# Altium schematic symbol library NXP_60_26022015.SCHLIB: 1306 symbols (part 24 of 28)
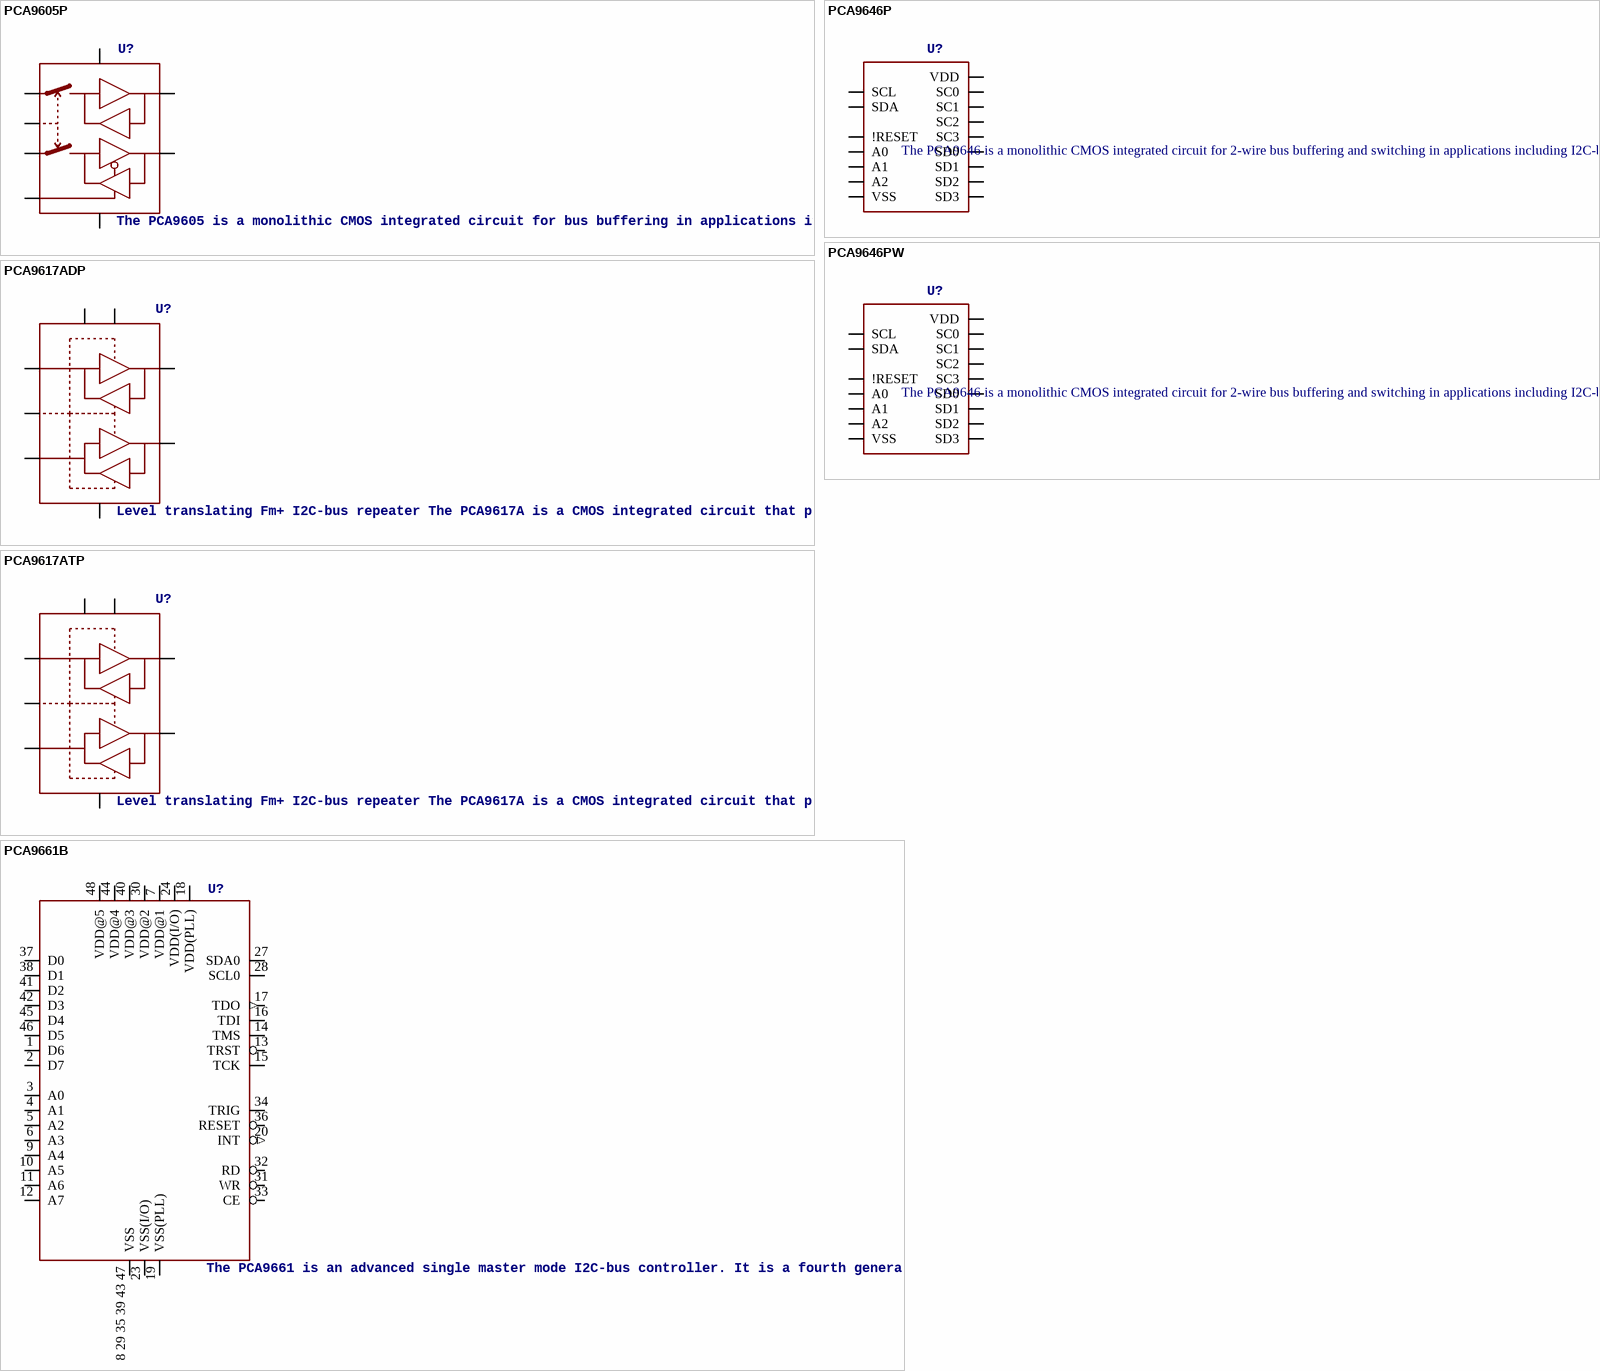
[diagram p208: symbols PCA9605P to PCA9661B]

## PCA9646P
designator U?, comment The PCA9646 is a monolithic CMOS integrated circuit for 2-wire bus buffering and switching in applications including I2C-bus, SMBus, PMBus, and other systems based on similar principles.   AAL Eindhoven MK
footprint SOT109-1
pins: 1 A0, 2 A1, 3 !RESET, 4 SD0, 5 SC0, 6 SD1, 7 SC1, 8 VSS (power), 9 SD2, 10 SC2, 11 SD3, 12 SC3, 13 A2, 14 SCL, 15 SDA, 16 VDD (power)

## PCA9646PW
designator U?, comment The PCA9646 is a monolithic CMOS integrated circuit for 2-wire bus buffering and switching in applications including I2C-bus, SMBus, PMBus, and other systems based on similar principles.   AAL Eindhoven MK
footprint SOT403-1
pins: 1 A0, 2 A1, 3 !RESET, 4 SD0, 5 SC0, 6 SD1, 7 SC1, 8 VSS (power), 9 SD2, 10 SC2, 11 SD3, 12 SC3, 13 A2, 14 SCL, 15 SDA, 16 VDD (power)

## PCA9661B
designator U?, comment The PCA9661 is an advanced single master mode I2C-bus controller. It is a fourth generation bus controller designed for data intensive I2C-bus data transfers. AAL Eindhoven MK
footprint SOT313-2
pins: 1 D6, 2 D7, 3 A0, 4 A1, 5 A2, 6 A3, 7 VDD@1 (power), 8 29 35 39 43 47 VSS (power), 9 A4, 10 A5, 11 A6, 12 A7, 13 TRST, 14 TMS, 15 TCK, 16 TDI, 17 TDO (out), 18 VDD(PLL) (power), 19 VSS(PLL) (power), 20 INT (out), 23 VSS(I/O) (power), 24 VDD(I/O) (power), 27 SDA0, 28 SCL0, 30 VDD@2 (power), 31 WR, 32 RD, 33 CE, 34 TRIG, 36 RESET, 37 D0, 38 D1, 40 VDD@3 (power), 41 D2, 42 D3, 44 VDD@4 (power), 45 D4, 46 D5, 48 VDD@5 (power)

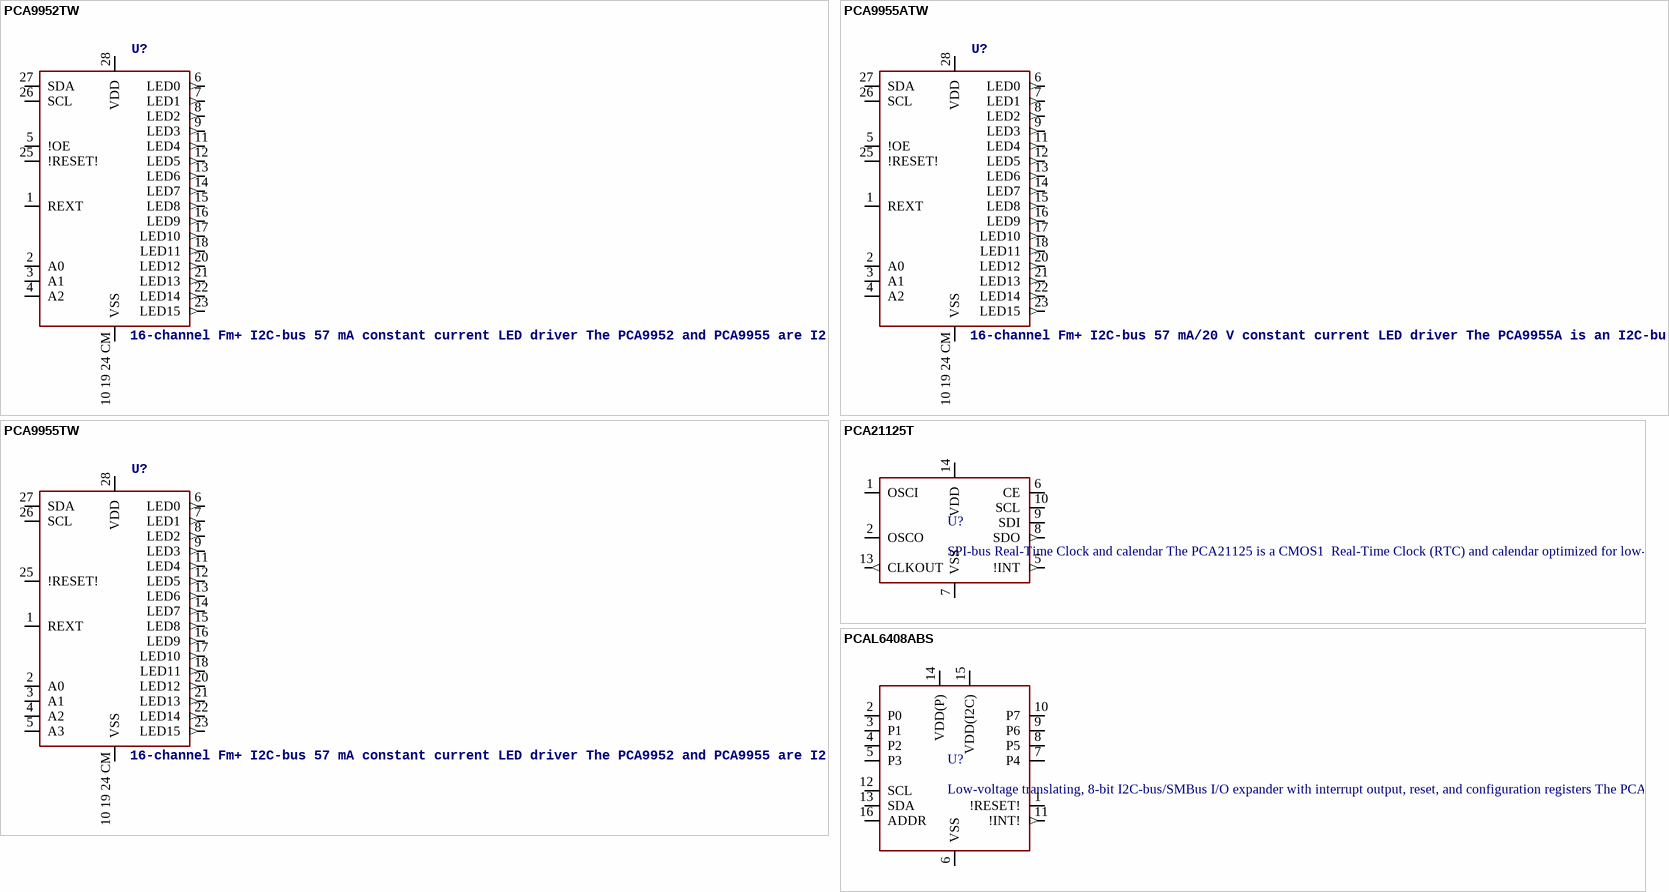
[diagram p161: symbols PCA9952TW to PCAL6408ABS]

## PCA9952TW
designator U?, comment 16-channel Fm+ I2C-bus 57 mA constant current LED driver The PCA9952 and PCA9955 are I2 C-bus controlled 16-channel constant current LED driver optimized for dimming and blinking 57 mA Red/Green/Blue/Amber (RGBA) LEDs in amusement products. Each LEDn output has its own 8-bit resolution (256 steps) fixed frequency individual PWM controller that operates at 31.25 kHz with a duty cycle that is adjustable from 0 % to 99.6 % to allow the LED to be set to a specific brightness value. An additional 8-bit resolution (256 steps) group PWM controller has both a fixed frequency of 122 Hz and an adjustable frequency between 15 Hz to once every 16.8 seconds with a duty cycle that is adjustable from 0 % to 99.6 % that is used to either dim or blink all LEDs with the same value. Each LEDn output can be off, on (no PWM control), set at its individual PWM controller value or at both individual and group PWM controller values. The PCA9952 and PCA9955 operate with a supply voltage range of 3 V to 5.5 V and the constant current sink LEDn outputs allow up to 40 V for the LED supply. The output peak current is adjustable with an 8-bit linear DAC from 225 uA to 57 mA. These devices have built-in open, short load and overtemperature detection circuitry. The error information from the corresponding register can be read via the I2 C-bus. Additionally, a thermal shutdown feature protects the device when internal junction temperature exceeds the limit allowed for the process. The PCA9952 and PCA9955 devices have Fast-mode Plus (Fm+) I2 C-bus interface. Fm+ devices offer higher frequency (up to 1 MHz) or more densely populated bus operation (up to 4000 pF). The PCA9952 is identical to PCA9955 except for the following differences: The PCA9952 has only three hardware address pins compared to four on PCA9955.  The PCA9952 has an output enable pin (OE) and the PCA9955 does not.   The active LOW output enable input pin (OE), available only on PCA9952, blinks all the LEDn outputs and can be used to externally PWM the outputs, which is useful when multiple devices need to be dimmed or blinked together without using software control. Software programmable LED Group and three Sub Call I2 C-bus addresses allow all or defined groups of PCA9952/55 devices to respond to a common I2 C-bus address, allowing for example, all red LEDs to be turned on or off at the same time or marquee chasing effect, thus minimizing I2 C-bus commands. On power-up, PCA9952/55 will have a unique Sub Call address to identify it as a 16-channel LED driver. This allows mixing of devices with different channel widths. Four hardware address pins on PCA9955 allow up to 16 devices on the same bus. In the case of PCA9952, three hardware address pins allow up to 8 devices on the same bus. The Software Reset (SWRST) function allows the master to perform a reset of the PCA9952/55 through the I2 C-bus, identical to the Power-On Reset (POR) that initializes the registers to their default state causing the output current switches to be OFF (LED off). This allows an easy and quick way to reconfigure all device registers to the same condition.    AAL Eindhoven MK
footprint SOT1172-2
pins: 1 REXT, 2 A0, 3 A1, 4 A2, 5 !OE, 6 LED0 (out), 7 LED1 (out), 8 LED2 (out), 9 LED3 (out), 10 19 24 CM VSS (power), 11 LED4 (out), 12 LED5 (out), 13 LED6 (out), 14 LED7 (out), 15 LED8 (out), 16 LED9 (out), 17 LED10 (out), 18 LED11 (out), 20 LED12 (out), 21 LED13 (out), 22 LED14 (out), 23 LED15 (out), 25 !RESET!, 26 SCL, 27 SDA, 28 VDD (power)

## PCA9955ATW
designator U?, comment 16-channel Fm+ I2C-bus 57 mA/20 V constant current LED driver The PCA9955A is an I2C-bus controlled 16-channel constant current LED driver optimized for dimming and blinking 57 mA Red/Green/Blue/Amber (RGBA) LEDs in amusement products. Each LED output has its own 8-bit resolution (256 steps) fixed frequency individual PWM controller that operates at 31.25 kHz with a duty cycle that is adjustable from 0 % to 100 % to allow the LED to be set to a specific brightness value. An additional 8-bit resolution (256 steps) group PWM controller has both a fixed frequency of 122 Hz and an adjustable frequency between 15 Hz to once every 16.8 seconds with a duty cycle that is adjustable from 0 % to 99.6 % that is used to either dim or blink all LEDs with the same value.    AAL Eindhoven MK
footprint SOT1172-3
pins: 1 REXT, 2 A0, 3 A1, 4 A2, 5 !OE, 6 LED0 (out), 7 LED1 (out), 8 LED2 (out), 9 LED3 (out), 10 19 24 CM VSS (power), 11 LED4 (out), 12 LED5 (out), 13 LED6 (out), 14 LED7 (out), 15 LED8 (out), 16 LED9 (out), 17 LED10 (out), 18 LED11 (out), 20 LED12 (out), 21 LED13 (out), 22 LED14 (out), 23 LED15 (out), 25 !RESET!, 26 SCL, 27 SDA, 28 VDD (power)

## PCA9955TW
designator U?, comment 16-channel Fm+ I2C-bus 57 mA constant current LED driver The PCA9952 and PCA9955 are I2 C-bus controlled 16-channel constant current LED driver optimized for dimming and blinking 57 mA Red/Green/Blue/Amber (RGBA) LEDs in amusement products. Each LEDn output has its own 8-bit resolution (256 steps) fixed frequency individual PWM controller that operates at 31.25 kHz with a duty cycle that is adjustable from 0 % to 99.6 % to allow the LED to be set to a specific brightness value. An additional 8-bit resolution (256 steps) group PWM controller has both a fixed frequency of 122 Hz and an adjustable frequency between 15 Hz to once every 16.8 seconds with a duty cycle that is adjustable from 0 % to 99.6 % that is used to either dim or blink all LEDs with the same value. Each LEDn output can be off, on (no PWM control), set at its individual PWM controller value or at both individual and group PWM controller values. The PCA9952 and PCA9955 operate with a supply voltage range of 3 V to 5.5 V and the constant current sink LEDn outputs allow up to 40 V for the LED supply. The output peak current is adjustable with an 8-bit linear DAC from 225 uA to 57 mA. These devices have built-in open, short load and overtemperature detection circuitry. The error information from the corresponding register can be read via the I2 C-bus. Additionally, a thermal shutdown feature protects the device when internal junction temperature exceeds the limit allowed for the process. The PCA9952 and PCA9955 devices have Fast-mode Plus (Fm+) I2 C-bus interface. Fm+ devices offer higher frequency (up to 1 MHz) or more densely populated bus operation (up to 4000 pF). The PCA9952 is identical to PCA9955 except for the following differences: The PCA9952 has only three hardware address pins compared to four on PCA9955.  The PCA9952 has an output enable pin (OE) and the PCA9955 does not.   The active LOW output enable input pin (OE), available only on PCA9952, blinks all the LEDn outputs and can be used to externally PWM the outputs, which is useful when multiple devices need to be dimmed or blinked together without using software control. Software programmable LED Group and three Sub Call I2 C-bus addresses allow all or defined groups of PCA9952/55 devices to respond to a common I2 C-bus address, allowing for example, all red LEDs to be turned on or off at the same time or marquee chasing effect, thus minimizing I2 C-bus commands. On power-up, PCA9952/55 will have a unique Sub Call address to identify it as a 16-channel LED driver. This allows mixing of devices with different channel widths. Four hardware address pins on PCA9955 allow up to 16 devices on the same bus. In the case of PCA9952, three hardware address pins allow up to 8 devices on the same bus. The Software Reset (SWRST) function allows the master to perform a reset of the PCA9952/55 through the I2 C-bus, identical to the Power-On Reset (POR) that initializes the registers to their default state causing the output current switches to be OFF (LED off). This allows an easy and quick way to reconfigure all device registers to the same condition.    AAL Eindhoven MK
footprint SOT1172-2
pins: 1 REXT, 2 A0, 3 A1, 4 A2, 5 A3, 6 LED0 (out), 7 LED1 (out), 8 LED2 (out), 9 LED3 (out), 10 19 24 CM VSS (power), 11 LED4 (out), 12 LED5 (out), 13 LED6 (out), 14 LED7 (out), 15 LED8 (out), 16 LED9 (out), 17 LED10 (out), 18 LED11 (out), 20 LED12 (out), 21 LED13 (out), 22 LED14 (out), 23 LED15 (out), 25 !RESET!, 26 SCL, 27 SDA, 28 VDD (power)

## PCA21125T
designator U?, comment SPI-bus Real-Time Clock and calendar The PCA21125 is a CMOS1  Real-Time Clock (RTC) and calendar optimized for low-power consumption and an operating temperature up to 125 °C. Data is transferred via a Serial Peripheral Interface (SPI-bus) with a maximum data rate of 6.0 Mbit/s. Alarm and timer functions are also available with the possibility to generate a wake-up signal on the interrupt pin. AEC Q100 compliant for automotive applications.    AAL Eindhoven MK
footprint SOT402-1
pins: 1 OSCI, 2 OSCO, 5 !INT (out), 6 CE, 7 VSS (power), 8 SDO (out), 9 SDI, 10 SCL, 13 CLKOUT (out), 14 VDD (power)

## PCAL6408ABS
designator U?, comment Low-voltage translating, 8-bit I2C-bus/SMBus I/O expander with interrupt output, reset, and configuration registers The PCAL6408A is an 8-bit general purpose I/O expander that provides remote I/O expansion for most microcontroller families via the I2C-bus interface.    AAL Eindhoven MK
footprint SOT758-1
pins: 1 !RESET!, 2 P0, 3 P1, 4 P2, 5 P3, 6 VSS, 7 P4, 8 P5, 9 P6, 10 P7, 11 !INT! (out), 12 SCL, 13 SDA, 14 VDD(P) (power), 15 VDD(I2C) (power), 16 ADDR

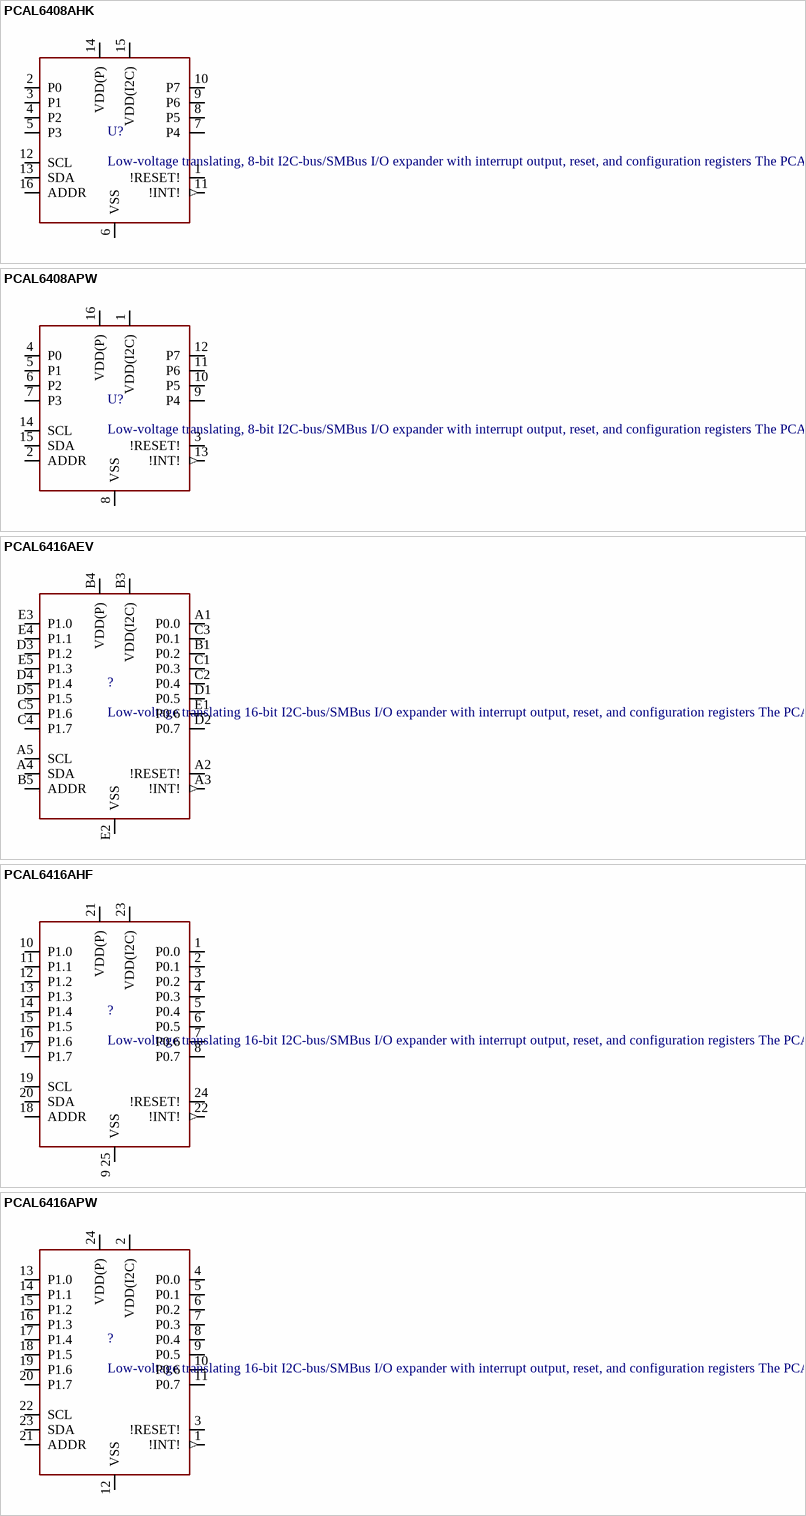
[diagram p162: symbols PCAL6408AHK to PCAL6416APW]

## PCAL6408AHK
designator U?, comment Low-voltage translating, 8-bit I2C-bus/SMBus I/O expander with interrupt output, reset, and configuration registers The PCAL6408A is an 8-bit general purpose I/O expander that provides remote I/O expansion for most microcontroller families via the I2C-bus interface.    AAL Eindhoven MK
footprint SOT1161-1
pins: 1 !RESET!, 2 P0, 3 P1, 4 P2, 5 P3, 6 VSS, 7 P4, 8 P5, 9 P6, 10 P7, 11 !INT! (out), 12 SCL, 13 SDA, 14 VDD(P) (power), 15 VDD(I2C) (power), 16 ADDR

## PCAL6408APW
designator U?, comment Low-voltage translating, 8-bit I2C-bus/SMBus I/O expander with interrupt output, reset, and configuration registers The PCAL6408A is an 8-bit general purpose I/O expander that provides remote I/O expansion for most microcontroller families via the I2C-bus interface.    AAL Eindhoven MK
footprint SOT403-1
pins: 1 VDD(I2C) (power), 2 ADDR, 3 !RESET!, 4 P0, 5 P1, 6 P2, 7 P3, 8 VSS, 9 P4, 10 P5, 11 P6, 12 P7, 13 !INT! (out), 14 SCL, 15 SDA, 16 VDD(P) (power)

## PCAL6416AEV
designator ?, comment Low-voltage translating 16-bit I2C-bus/SMBus I/O expander with interrupt output, reset, and configuration registers The PCAL6416A is a 16-bit general-purpose I/O expander that provides remote I/O expansion for most microcontroller families via the I2C-bus interface. NXP I/O expanders provide a simple solution when additional I/Os are needed while keeping interconnections to a minimum, for example, in battery-powered mobile applications for interfacing to sensors, push buttons, keypad, etc. In addition to providing a flexible set of GPIOs, it simplifies interconnection of a processor running at one voltage level to I/O devices operating at a different (usually higher) voltage level. The PCAL6416A has built-in level shifting feature that makes these devices extremely flexible in mixed signal environments where communication between incompatible I/O voltages is required. Its wide VDD range of 1.65 V to 5.5 V on the dual power rail allows seamless communications with next-generation low voltage microprocessors and microcontrollers on the interface side (SDA/SCL) and peripherals at a higher voltage on the port side. There are two supply voltages for PCAL6416A: VDD(I2C-bus) and VDD(P). VDD(I2C-bus) provides the supply voltage for the interface at the master side (for example, a microcontroller) and the VDD(P) provides the supply for core circuits and Port P. The bidirectional voltage level translation in the PCAL6416A is provided through VDD(I2C-bus). VDD(I2C-bus) should be connected to the VDD of the external SCL/SDA lines. This indicates the VDD level of the I2C-bus to the PCAL6416A, while the voltage level on Port P of the PCAL6416A is determined by the VDD(P). The PCAL6416A contains the PCA6416A register set of four pairs of 8-bit Configuration, Input, Output, and Polarity Inversion registers and additionally, the PCAL6416A has Agile I/O, which are additional features specifically designed to enhance the I/O. These additional features are: programmable output drive strength, latchable inputs, programmable pull-up/pull-down resistors, maskable interrupt, interrupt status register, programmable open-drain or push-pull outputs. The PCAL6416A is a pin-to-pin replacement to the PCA6416A, however, the PCAL6416A powers up with all I/O interrupts masked. This mask default allows for a board bring-up free of spurious interrupts at power-up. At power-on, the I/Os are configured as inputs. However, the system master can enable the I/Os as either inputs or outputs by writing to the I/O configuration bits. The data for each input or output is kept in the corresponding input or output register. The polarity of the Input Port register can be inverted with the Polarity Inversion register, saving external logic gates. Programmable pull-up and pull-down resistors eliminate the need for discrete components.    AAL Eindhoven MK
footprint SOT1199-1
pins: A1 P0.0, A2 !RESET!, A3 !INT! (out), A4 SDA, A5 SCL, B1 P0.2, B3 VDD(I2C) (power), B4 VDD(P) (power), B5 ADDR, C1 P0.3, C2 P0.4, C3 P0.1, C4 P1.7, C5 P1.6, D1 P0.5, D2 P0.7, D3 P1.2, D4 P1.4, D5 P1.5, E1 P0.6, E2 VSS, E3 P1.0, E4 P1.1, E5 P1.3

## PCAL6416AHF
designator ?, comment Low-voltage translating 16-bit I2C-bus/SMBus I/O expander with interrupt output, reset, and configuration registers The PCAL6416A is a 16-bit general-purpose I/O expander that provides remote I/O expansion for most microcontroller families via the I2C-bus interface. NXP I/O expanders provide a simple solution when additional I/Os are needed while keeping interconnections to a minimum, for example, in battery-powered mobile applications for interfacing to sensors, push buttons, keypad, etc. In addition to providing a flexible set of GPIOs, it simplifies interconnection of a processor running at one voltage level to I/O devices operating at a different (usually higher) voltage level. The PCAL6416A has built-in level shifting feature that makes these devices extremely flexible in mixed signal environments where communication between incompatible I/O voltages is required. Its wide VDD range of 1.65 V to 5.5 V on the dual power rail allows seamless communications with next-generation low voltage microprocessors and microcontrollers on the interface side (SDA/SCL) and peripherals at a higher voltage on the port side. There are two supply voltages for PCAL6416A: VDD(I2C-bus) and VDD(P). VDD(I2C-bus) provides the supply voltage for the interface at the master side (for example, a microcontroller) and the VDD(P) provides the supply for core circuits and Port P. The bidirectional voltage level translation in the PCAL6416A is provided through VDD(I2C-bus). VDD(I2C-bus) should be connected to the VDD of the external SCL/SDA lines. This indicates the VDD level of the I2C-bus to the PCAL6416A, while the voltage level on Port P of the PCAL6416A is determined by the VDD(P). The PCAL6416A contains the PCA6416A register set of four pairs of 8-bit Configuration, Input, Output, and Polarity Inversion registers and additionally, the PCAL6416A has Agile I/O, which are additional features specifically designed to enhance the I/O. These additional features are: programmable output drive strength, latchable inputs, programmable pull-up/pull-down resistors, maskable interrupt, interrupt status register, programmable open-drain or push-pull outputs. The PCAL6416A is a pin-to-pin replacement to the PCA6416A, however, the PCAL6416A powers up with all I/O interrupts masked. This mask default allows for a board bring-up free of spurious interrupts at power-up. At power-on, the I/Os are configured as inputs. However, the system master can enable the I/Os as either inputs or outputs by writing to the I/O configuration bits. The data for each input or output is kept in the corresponding input or output register. The polarity of the Input Port register can be inverted with the Polarity Inversion register, saving external logic gates. Programmable pull-up and pull-down resistors eliminate the need for discrete components.    AAL Eindhoven MK
footprint SOT994-1
pins: 1 P0.0, 2 P0.1, 3 P0.2, 4 P0.3, 5 P0.4, 6 P0.5, 7 P0.6, 8 P0.7, 9 25 VSS, 10 P1.0, 11 P1.1, 12 P1.2, 13 P1.3, 14 P1.4, 15 P1.5, 16 P1.6, 17 P1.7, 18 ADDR, 19 SCL, 20 SDA, 21 VDD(P) (power), 22 !INT! (out), 23 VDD(I2C) (power), 24 !RESET!

## PCAL6416APW
designator ?, comment Low-voltage translating 16-bit I2C-bus/SMBus I/O expander with interrupt output, reset, and configuration registers The PCAL6416A is a 16-bit general-purpose I/O expander that provides remote I/O expansion for most microcontroller families via the I2C-bus interface. NXP I/O expanders provide a simple solution when additional I/Os are needed while keeping interconnections to a minimum, for example, in battery-powered mobile applications for interfacing to sensors, push buttons, keypad, etc. In addition to providing a flexible set of GPIOs, it simplifies interconnection of a processor running at one voltage level to I/O devices operating at a different (usually higher) voltage level. The PCAL6416A has built-in level shifting feature that makes these devices extremely flexible in mixed signal environments where communication between incompatible I/O voltages is required. Its wide VDD range of 1.65 V to 5.5 V on the dual power rail allows seamless communications with next-generation low voltage microprocessors and microcontrollers on the interface side (SDA/SCL) and peripherals at a higher voltage on the port side. There are two supply voltages for PCAL6416A: VDD(I2C-bus) and VDD(P). VDD(I2C-bus) provides the supply voltage for the interface at the master side (for example, a microcontroller) and the VDD(P) provides the supply for core circuits and Port P. The bidirectional voltage level translation in the PCAL6416A is provided through VDD(I2C-bus). VDD(I2C-bus) should be connected to the VDD of the external SCL/SDA lines. This indicates the VDD level of the I2C-bus to the PCAL6416A, while the voltage level on Port P of the PCAL6416A is determined by the VDD(P). The PCAL6416A contains the PCA6416A register set of four pairs of 8-bit Configuration, Input, Output, and Polarity Inversion registers and additionally, the PCAL6416A has Agile I/O, which are additional features specifically designed to enhance the I/O. These additional features are: programmable output drive strength, latchable inputs, programmable pull-up/pull-down resistors, maskable interrupt, interrupt status register, programmable open-drain or push-pull outputs. The PCAL6416A is a pin-to-pin replacement to the PCA6416A, however, the PCAL6416A powers up with all I/O interrupts masked. This mask default allows for a board bring-up free of spurious interrupts at power-up. At power-on, the I/Os are configured as inputs. However, the system master can enable the I/Os as either inputs or outputs by writing to the I/O configuration bits. The data for each input or output is kept in the corresponding input or output register. The polarity of the Input Port register can be inverted with the Polarity Inversion register, saving external logic gates. Programmable pull-up and pull-down resistors eliminate the need for discrete components.    AAL Eindhoven MK
footprint SOT355-1
pins: 1 !INT! (out), 2 VDD(I2C) (power), 3 !RESET!, 4 P0.0, 5 P0.1, 6 P0.2, 7 P0.3, 8 P0.4, 9 P0.5, 10 P0.6, 11 P0.7, 12 VSS, 13 P1.0, 14 P1.1, 15 P1.2, 16 P1.3, 17 P1.4, 18 P1.5, 19 P1.6, 20 P1.7, 21 ADDR, 22 SCL, 23 SDA, 24 VDD(P) (power)

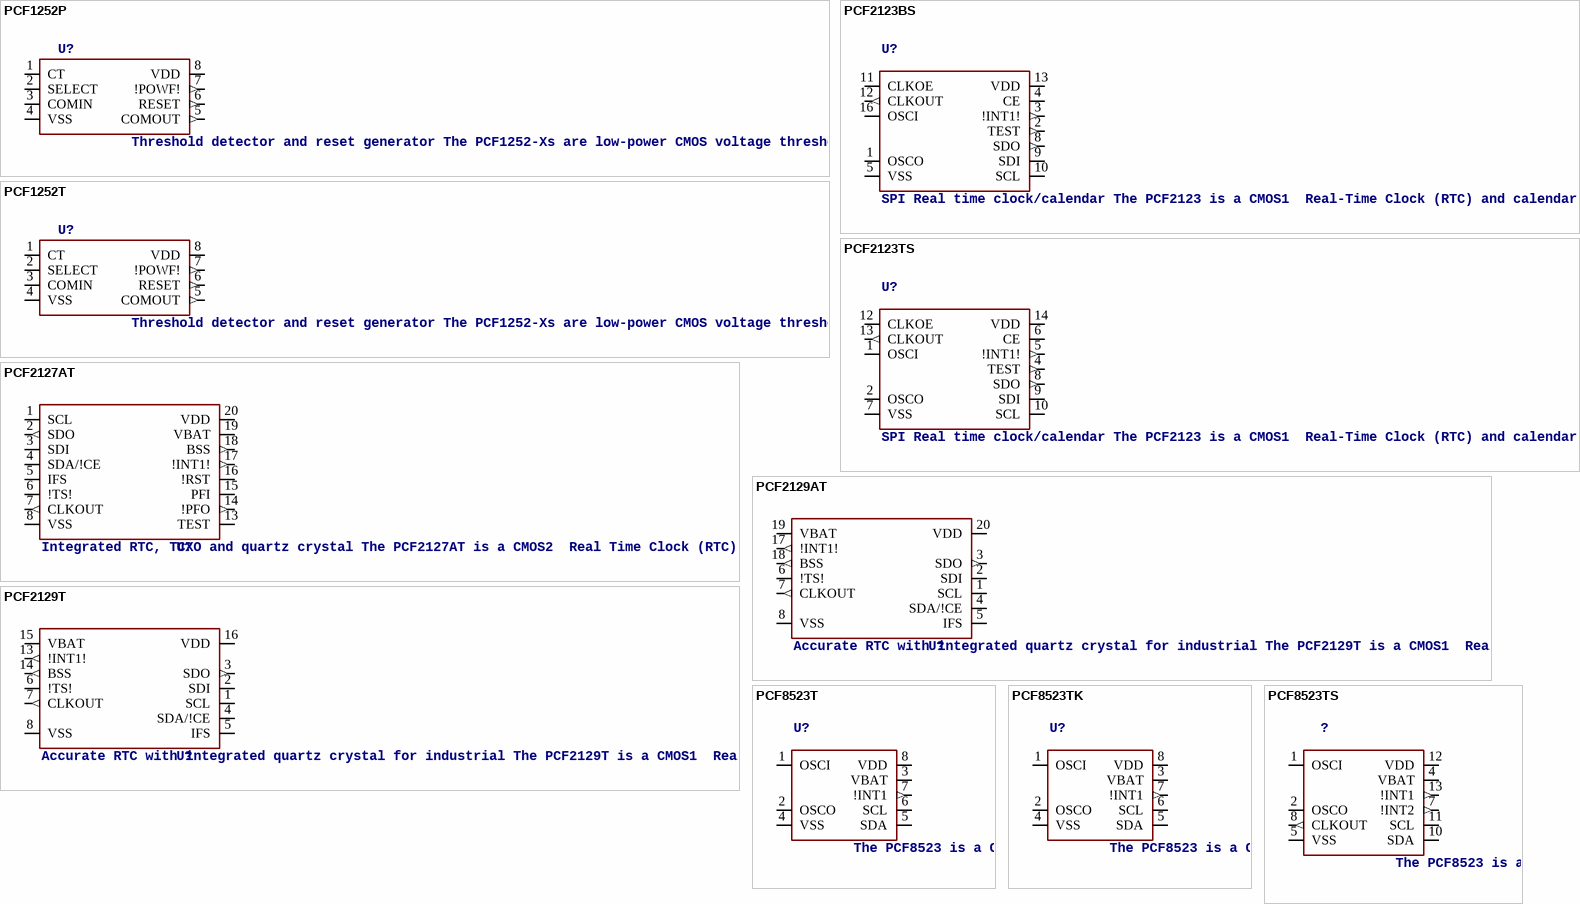
[diagram p163: symbols PCF1252P to PCF8523TS]

## PCF1252P
designator U?, comment Threshold detector and reset generator The PCF1252-Xs are low-power CMOS voltage threshold detectors designed especially for supervision of microcontroller/microprocessor systems for detection of power-on/off conditions and generation of a system reset pulse. The PCF1252-X also provides a POWF (power fail) output which is activated at a precise factory-programmed trip point. A system RESET output has a built-in delay with duration determined by an external capacitor (CCT). A second comparator (comparator 2) has been included to enable the possibility of a second monitoring point in the system.    AAL Eindhoven MK
footprint SOT97-1
pins: 1 CT, 2 SELECT, 3 COMIN, 4 VSS (power), 5 COMOUT (out), 6 RESET (out), 7 !POWF! (out), 8 VDD (power)

## PCF1252T
designator U?, comment Threshold detector and reset generator The PCF1252-Xs are low-power CMOS voltage threshold detectors designed especially for supervision of microcontroller/microprocessor systems for detection of power-on/off conditions and generation of a system reset pulse. The PCF1252-X also provides a POWF (power fail) output which is activated at a precise factory-programmed trip point. A system RESET output has a built-in delay with duration determined by an external capacitor (CCT). A second comparator (comparator 2) has been included to enable the possibility of a second monitoring point in the system.    AAL Eindhoven MK
footprint SOT96-1
pins: 1 CT, 2 SELECT, 3 COMIN, 4 VSS (power), 5 COMOUT (out), 6 RESET (out), 7 !POWF! (out), 8 VDD (power)

## PCF2123BS
designator U?, comment SPI Real time clock/calendar The PCF2123 is a CMOS1  Real-Time Clock (RTC) and calendar optimized for low power applications. Data is transferred serially via a Serial Peripheral Interface (SPI-bus) with a maximum data rate of 6.25 Mbit/s. An alarm and timer function is also available providing the possibility to generate a wake-up signal on an interrupt pin. An offset register allows fine tuning of the clock.    AAL Eindhoven MK
footprint SOT758-1
pins: 1 OSCO, 2 TEST (out), 3 !INT1! (out), 4 CE, 5 VSS (power), 8 SDO (out), 9 SDI, 10 SCL, 11 CLKOE, 12 CLKOUT (out), 13 VDD (power), 16 OSCI

## PCF2123TS
designator U?, comment SPI Real time clock/calendar The PCF2123 is a CMOS1  Real-Time Clock (RTC) and calendar optimized for low power applications. Data is transferred serially via a Serial Peripheral Interface (SPI-bus) with a maximum data rate of 6.25 Mbit/s. An alarm and timer function is also available providing the possibility to generate a wake-up signal on an interrupt pin. An offset register allows fine tuning of the clock.    AAL Eindhoven MK
footprint SOT402-1
pins: 1 OSCI, 2 OSCO, 4 TEST (out), 5 !INT1! (out), 6 CE, 7 VSS (power), 8 SDO (out), 9 SDI, 10 SCL, 12 CLKOE, 13 CLKOUT (out), 14 VDD (power)
